# Altium footprint library heromap.PcbLib: 593 footprints (part 22 of 38)
Each footprint in its own frame and in the unit in brackets; x right, y up, seen from the top. Pads: shape width x height; smd on the part's side, far side on the other; paste and mask are expansions set on the pad; w line width, h text height; cw(c..) or ccw(c..) is an arc to the next point about the centre after c.
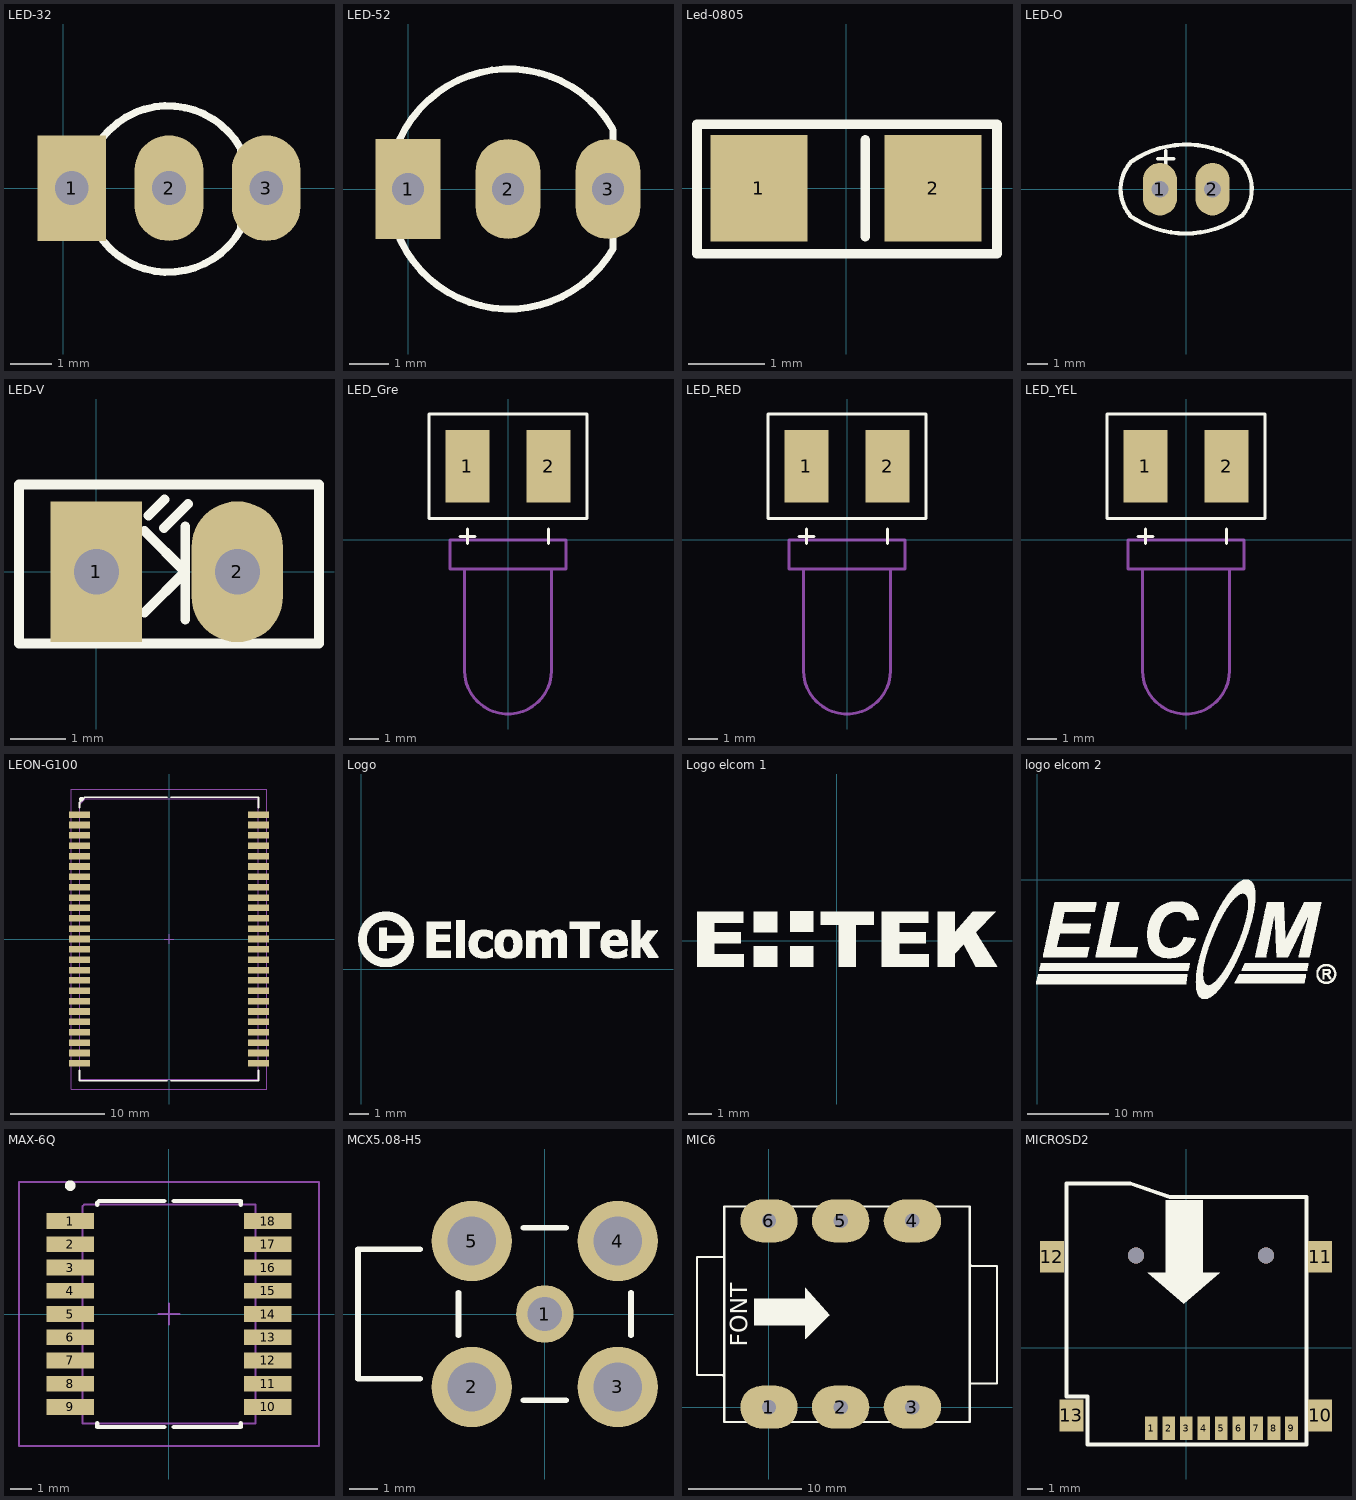
[diagram p21: the footprints below, top view; thin cyan lines are the x and y axes]

## LED-32 [mil] "LED 3 PIN, 3ly Two colour"
height 300
pads (3):
  rect 65x100 hole 32: 1(8,0)
  oval 65x100 hole 32: 2(100,0) 3(192,0)
Top Overlay:
  lines w7: 168,-39 168,37
  lines w7.01: 167.87,37.48 ccw(c99.08,-0.84) 167.97,-38.98

## LED-52 [mil] "LED 3 PIN, 5 ly , Two colour"
height 300
pads (3):
  rect 65x100 hole 32: 1(0,0)
  oval 65x100 hole 32: 2(100,0) 3(200,0)
Top Overlay:
  lines w7: 204.51,60.71 ccw(c101,0) 204.94,-59.97 ; 205,-59 205,59

## Led-0805 [mil] "Compoment SMD 80x50mil"
height 50
pads (2):
  rect 50x55 smd: 1(-45,0) 2(45,0)
Top Overlay:
  lines w5: 10,-25 10,25 ; -77,-34 78,-34 78,33 -77,33 -77,-34
3D body: height 31.5, standoff 7.87, extent -30,-20 30,20
3D body: height 11.81, standoff 0, extent -50,-25 55,25

## LED-O [mil] "LED 2 PIN,  Ovan Only colour, pin to pin 110mil"
height 300
pads (2):
  oval 65x100 hole 32: 1(-50,0) 2(50,0)
Top Overlay:
  lines w7: -54,58 -24,58 ; -39,43 -39,73
  lines w8: -106.82,-49.85 cw(c-47,0) -104.5,52.5 ; -106.38,-51.11 ccw(c-0.81,100.81) 104.97,-50.96 ; -102.83,53.79 cw(c0,-100) 103.93,53.04 ; 104.5,52.5 cw(c47,0) 106.82,-49.85

## LED-V [mil] "LED 2 PIN, Rectang Only colour"
height 300
pads (2):
  rect 65x100 hole 32: 1(0,0)
  oval 65x100 hole 32: 2(100,0)
Top Overlay:
  lines w7: 34,-29 63,0 34,29 ; 37,40 48.3,51.3 ; 48,31 65,48 ; 63,-34 63,32 ; -55,-51 -55,62 158,62 158,-51 -55,-51

## LED_Gre [mil]
pads (2):
  rect 60x98.43 smd: 1(-55,100) 2(55,100)
Top Overlay:
  lines w4: -65,5 -55,5 ; -55,-5 -55,5 ; -55,15 -55,5 ; -45,5 -55,5 ; 55,-5 55,5 55,15 ; -107,29 -107,171 107,171 107,29 -107,29
Mechanical 1:
  lines w4: -59.04,-39.37 -59.04,-177.15 ccw(c0,-177.17) 59.06,-177.17 59.06,-39.39 ; -78.74,-39.37 -78.74,0 78.74,0 78.74,-39.37 -78.74,-39.37
3D body: height 15.75, standoff 0, extent 45,90 65,130
3D body: height 66.93, standoff 0, extent 45,75 65,90
3D body: height 66.93, standoff 51.18, extent 45,0 65,75
3D body: height 118.11, standoff 0, extent -59.32,-236.49 58.17,-118.88
3D body: height 137.64, standoff -19.53, extent -78.72,-39.35 78.14,0.02
3D body: height 117.99, standoff 0.12, extent -59.04,-177.15 58.61,-39.35
3D body: height 66.93, standoff 51.18, extent -65,0 -45,75
3D body: height 66.93, standoff 0, extent -65,75 -45,90
3D body: height 15.75, standoff 0, extent -65,90 -45,130

## LED_RED [mil]
pads (2):
  rect 60x98.43 smd: 1(-55,100) 2(55,100)
Top Overlay:
  lines w4: -65,5 -55,5 ; -55,-5 -55,5 ; -55,15 -55,5 ; -45,5 -55,5 ; 55,-5 55,5 55,15 ; -107,29 -107,171 107,171 107,29 -107,29
Mechanical 1:
  lines w4: -59.04,-39.37 -59.04,-177.15 ccw(c0,-177.17) 59.06,-177.17 59.06,-39.39 ; -78.74,-39.37 -78.74,0 78.74,0 78.74,-39.37 -78.74,-39.37
3D body: height 118.11, standoff 0, extent -59.32,-236.49 58.17,-118.88
3D body: height 137.64, standoff -19.53, extent -78.72,-39.35 78.14,0.02
3D body: height 117.99, standoff 0.12, extent -59.04,-177.15 58.61,-39.35
3D body: height 66.93, standoff -39.37, extent 45,75 65,90
3D body: height 66.93, standoff 51.18, extent 45,0 65,75
3D body: height 66.93, standoff 51.18, extent -65,0 -45,75
3D body: height 66.93, standoff -39.37, extent -65,75 -45,90

## LED_YEL [mil]
pads (2):
  rect 60x98.43 smd: 1(-55,100) 2(55,100)
Top Overlay:
  lines w4: -65,5 -55,5 ; -55,-5 -55,5 ; -55,15 -55,5 ; -45,5 -55,5 ; 55,-5 55,5 55,15 ; -107,29 -107,171 107,171 107,29 -107,29
Mechanical 1:
  lines w4: -59.04,-39.37 -59.04,-177.15 ccw(c0,-177.17) 59.06,-177.17 59.06,-39.39 ; -78.74,-39.37 -78.74,0 78.74,0 78.74,-39.37 -78.74,-39.37
3D body: height 15.75, standoff 0, extent -65,90 -45,130
3D body: height 66.93, standoff 0, extent -65,75 -45,90
3D body: height 66.93, standoff 51.18, extent -65,0 -45,75
3D body: height 66.93, standoff 51.18, extent 45,0 65,75
3D body: height 66.93, standoff 0, extent 45,75 65,90
3D body: height 15.75, standoff 0, extent 45,90 65,130
3D body: height 118.11, standoff 0, extent -59.32,-236.49 58.17,-118.88
3D body: height 137.64, standoff -19.53, extent -78.72,-39.35 78.14,0.02
3D body: height 117.99, standoff 0.12, extent -59.04,-177.15 58.61,-39.35

## LEON-G100 [mm] "LCC, 50-Pins, Body 19,0x30,1mm (max), Pitch 1,10mm, IPC Medium Density"
height 3
pads (50):
  rect 2.2x0.7 smd: 1(-9.5,13.2) 2(-9.5,12.1) 3(-9.5,11) 4(-9.5,9.9) 5(-9.5,8.8) 6(-9.5,7.7) 7(-9.5,6.6) 8(-9.5,5.5) 9(-9.5,4.4) 10(-9.5,3.3) 11(-9.5,2.2) 12(-9.5,1.1) 13(-9.5,0) 14(-9.5,-1.1) 15(-9.5,-2.2) 16(-9.5,-3.3) 17(-9.5,-4.4) 18(-9.5,-5.5) 19(-9.5,-6.6) 20(-9.5,-7.7) 21(-9.5,-8.8) 22(-9.5,-9.9) 23(-9.5,-11) 24(-9.5,-12.1) 25(-9.5,-13.2) 26(9.5,-13.2) 27(9.5,-12.1) 28(9.5,-11) 29(9.5,-9.9) 30(9.5,-8.8) 31(9.5,-7.7) 32(9.5,-6.6) 33(9.5,-5.5) 34(9.5,-4.4) 35(9.5,-3.3) 36(9.5,-2.2) 37(9.5,-1.1) 38(9.5,0) 39(9.5,1.1) 40(9.5,2.2) 41(9.5,3.3) 42(9.5,4.4) 43(9.5,5.5) 44(9.5,6.6) 45(9.5,7.7) 46(9.5,8.8) 47(9.5,9.9) 48(9.5,11) 49(9.5,12.1) 50(9.5,13.2)
Top Overlay:
  circle w0.25: c-9.3,14.85 r0.125
  lines w0.2: -9.5,-13.95 -9.5,-15.05 -0.2,-15.05 ; -9.5,13.95 -9.5,14.5 -8.95,15.05 -0.2,15.05 ; 0.2,-15.05 9.5,-15.05 9.5,-13.95 ; 0.2,15.05 9.5,15.05 9.5,13.95
Mechanical 13:
  lines w0.1: -9.45,-14.875 -9.45,14.325 -8.9,14.875 9.45,14.875 9.45,-14.875 -9.45,-14.875
Mechanical 15:
  lines w0.1: -0.5,0 0.5,0 ; 0,-0.5 0,0.5 ; -10.4,-15.925 -10.4,15.925 10.4,15.925 10.4,-15.925 -10.4,-15.925
3D body: height 3, standoff 0, extent -9.45,-14.875 9.45,14.875

## Logo [mm] "LogoElcomTek"
Top Overlay:
  drawing of 942 lines, arcs and shapes, not listed

## Logo elcom 1 [mm]
Top Overlay:
  region: -3.988,-1.118 -3.988,-0.584 -5.258,-0.584 -5.258,-0.102 -4.115,-0.102 -4.115,0.356 -5.258,0.356 -5.258,0.762 -4.013,0.762 -4.013,1.245 -5.994,1.245 -5.994,-1.118
  region: -3.556,1.245 -2.565,1.245 -2.565,0.356 -3.556,0.356
  region: -2.007,1.27 -1.016,1.27 -1.016,0.381 -2.007,0.381
  region: -2.007,-0.229 -1.016,-0.229 -1.016,-1.118 -2.007,-1.118
  region: -3.556,-0.229 -2.565,-0.229 -2.565,-1.118 -3.556,-1.118
  region: -0.686,0.686 -0.686,1.245 1.575,1.245 1.575,0.686 0.813,0.686 0.813,-1.118 0.076,-1.118 0.076,0.686
  region: 3.937,-1.118 3.937,-0.584 2.667,-0.584 2.667,-0.102 3.81,-0.102 3.81,0.356 2.667,0.356 2.667,0.762 3.912,0.762 3.912,1.245 1.93,1.245 1.93,-1.118
  region: 4.318,1.245 4.318,-1.118 5.055,-1.118 5.055,-0.559 5.436,-0.152 5.944,-1.118 6.858,-1.118 5.944,0.356 6.807,1.245 5.817,1.245 5.055,0.356 5.055,1.245

## logo elcom 2 [mm]
height 2.54
Top Overlay:
  drawing of 3192 lines, arcs and shapes, not listed

## MAX-6Q [mm] "LCC, 18-Pins, Body 6,8x10,7mm (max), Pitch 1,10mm, IPC Medium Density"
height 2.7
pads (18):
  rect 2.25x0.75 smd: 1(-4.675,4.4) 2(-4.675,3.3) 3(-4.675,2.2) 4(-4.675,1.1) 5(-4.675,0) 6(-4.675,-1.1) 7(-4.675,-2.2) 8(-4.675,-3.3) 9(-4.675,-4.4) 10(4.675,-4.4) 11(4.675,-3.3) 12(4.675,-2.2) 13(4.675,-1.1) 14(4.675,0) 15(4.675,1.1) 16(4.675,2.2) 17(4.675,3.3) 18(4.675,4.4)
Top Overlay:
  circle w0.25: c-4.675,6.075 r0.125
  lines w0.2: -3.4,-5.175 -3.4,-5.35 -0.225,-5.35 ; -3.4,5.175 -3.4,5.262 -3.313,5.35 -0.225,5.35 ; 0.225,-5.35 3.4,-5.35 3.4,-5.175 ; 0.225,5.35 3.4,5.35 3.4,5.175
Mechanical 13:
  lines w0.1: -4.1,-5.175 -4.1,5.088 -4.012,5.175 4.1,5.175 4.1,-5.175 -4.1,-5.175
Mechanical 15:
  lines w0.1: -0.5,0 0.5,0 ; 0,-0.5 0,0.5 ; -7.1,-6.25 -7.1,6.25 7.1,6.25 7.1,-6.25 -7.1,-6.25
3D body: height 2.7, standoff 0, extent -4.1,-5.175 4.1,5.175

## MCX5.08-H5 [mm] "Connector; RF Coaxial, MCX, Thru-Hole; 5 Position; Right-Angle"
height 5.85
pads (5):
  round 2 hole 1.2: 1(0,0)
  round 2.8 hole 1.7: 2(-2.54,-2.54) 3(2.54,-2.54) 4(2.54,2.54) 5(-2.54,2.54)
Top Overlay:
  lines w0.2: -4.34,-2.25 -6.5,-2.25 -6.5,2.25 -4.34,2.25 ; -3,-0.74 -3,0.74 ; -0.74,-3 0.74,-3 ; -0.74,3 0.74,3 ; 3,-0.74 3,0.74
3D body "User Library-919-119J-51AX.STEP": height 5.9, standoff -3.94, extent -6.5,-3 3,3

## MIC6 [mm] "Jac Mic 6 pin to"
pads (6):
  oval 5.08x3.81 hole 1.27: 1(0,0) 2(6.35,0) 3(12.7,0) 4(12.7,16.51) 5(6.35,16.51) 6(0,16.51)
Top Overlay:
  region: -1.321,9.601 -1.321,7.264 3.251,7.264 3.226,7.29 3.226,6.071 3.251,6.071 5.334,8.153 5.359,8.153 3.226,10.592 3.226,9.601
  lines w0.178: -3.962,-1.295 -3.962,17.755 ; -3.962,2.261 -3.962,13.335 -4.013,13.284 -6.375,13.284 -6.375,2.845 -4.115,2.845 -3.962,2.692 ; -3.962,17.78 17.78,17.78 17.78,14.986 ; -3.937,-1.321 -3.912,-1.295 -3.886,-1.321 17.78,-1.321 17.78,2.083 ; 17.78,12.675 17.932,12.522 20.193,12.522 20.193,2.083 17.831,2.083 17.78,2.032 17.78,15.088
  text "FONT" at -1.905,5.334 h1.52

## MICROSD2 [mm]
pads (13):
  rect 0.8x1.5 smd: 1(-2.184,-5.039) 2(-1.084,-5.039) 3(0.016,-5.039) 4(1.116,-5.039) 5(2.216,-5.039) 6(3.316,-5.039) 7(4.416,-5.039) 8(5.516,-5.039) 9(6.616,-5.039)
  rect 1.5x2 smd: 10(8.407,-4.235) 11(8.407,5.715) 12(-8.407,5.715) 13(-7.188,-4.235)
via -3.15,5.791 diameter 1 hole 1
via 5.004,5.791 diameter 1 hole 1
Top Overlay:
  region: 1.041,9.246 -1.27,9.246 -1.27,4.674 -1.245,4.699 -2.413,4.699 -0.127,2.769 2.108,4.699 1.041,4.699
  lines w0.254: -7.493,-3.035 -7.493,10.325 -3.52,10.325 -1.016,9.461 7.544,9.461 7.544,-6.071 -6.172,-6.071 -6.172,-3.035 -7.493,-3.035
3D body: height 1.85, standoff 0, extent -7.493,-4.559 7.544,10.325
3D body "User Library-microsd card.step": height 1.2, standoff 0.2, extent -5.43,-2.376 5.582,12.624